# Altium footprint library PcbLib.PcbLib: 141 footprints (part 6 of 9)
Each footprint in its own frame and in the unit in brackets; x right, y up, seen from the top. Pads: shape width x height; smd on the part's side, far side on the other; paste and mask are expansions set on the pad; w line width, h text height; cw(c..) or ccw(c..) is an arc to the next point about the centre after c.
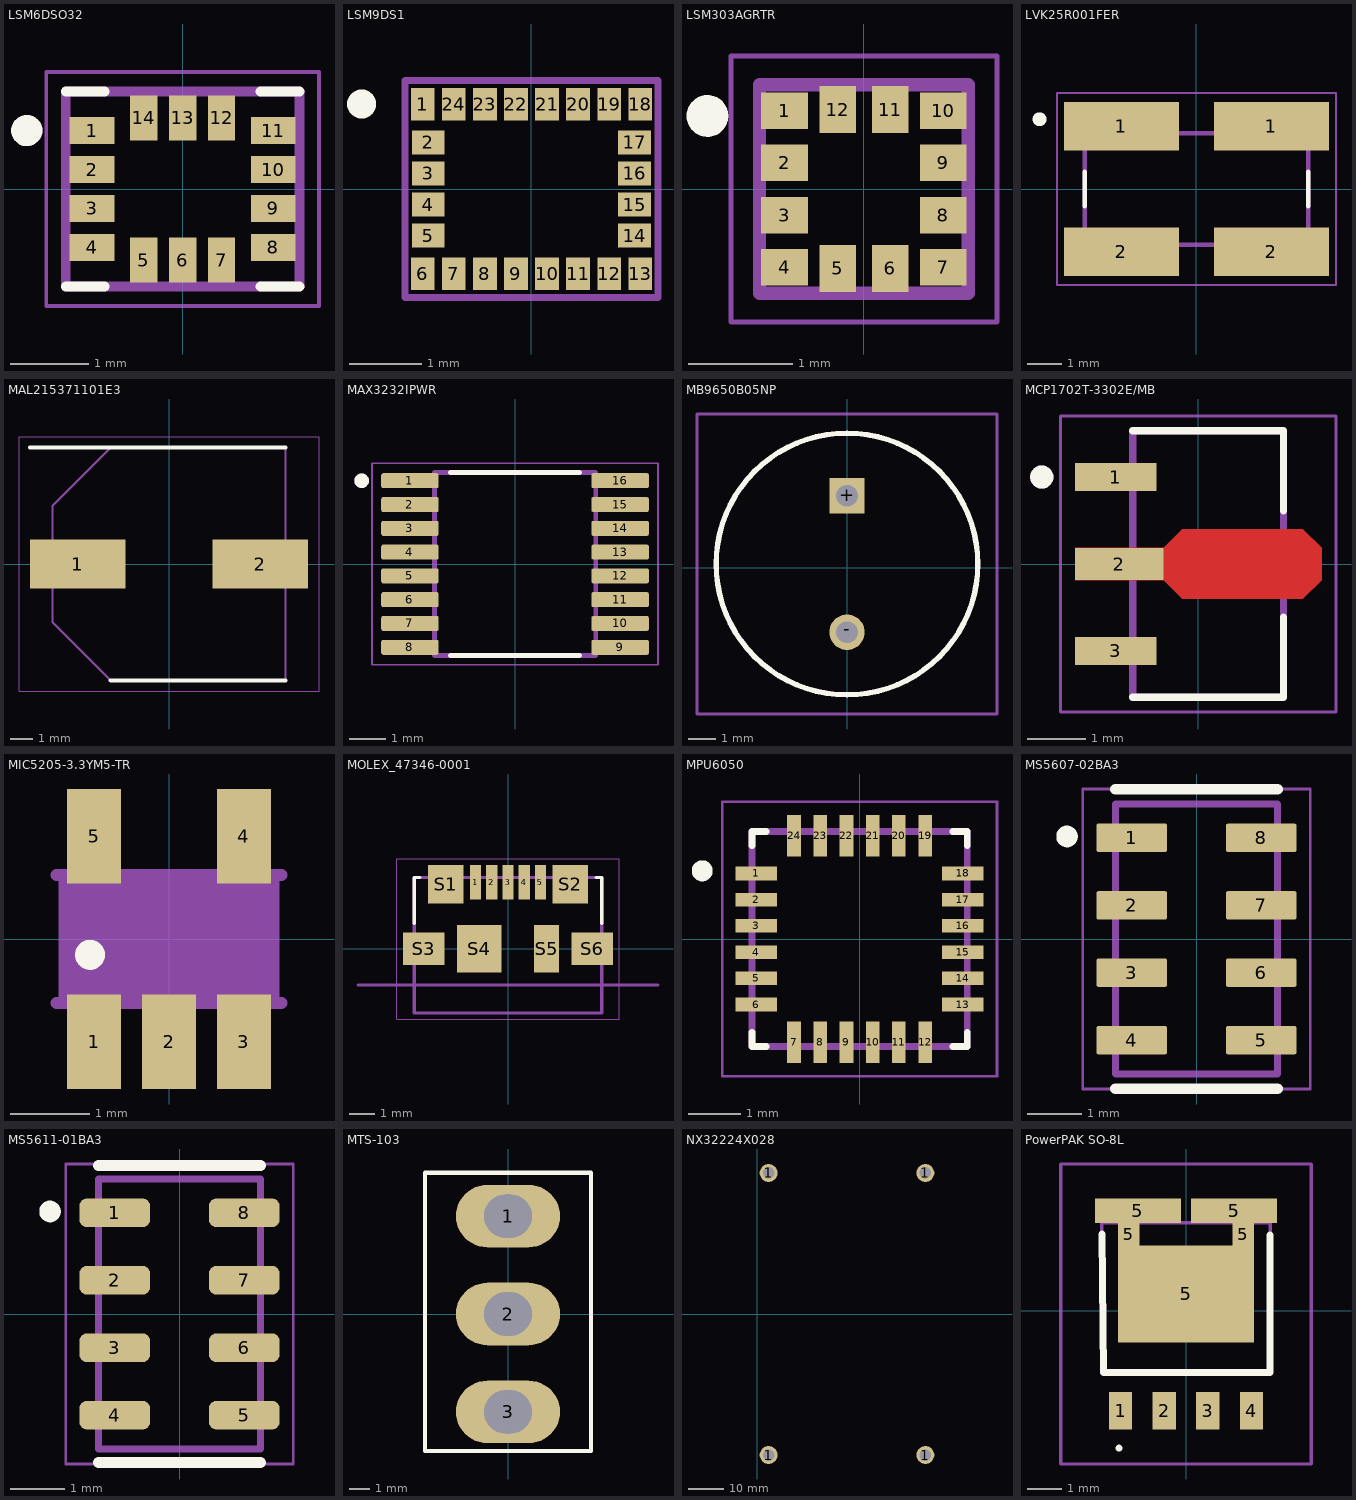
[diagram p5: the footprints below, top view; thin cyan lines are the x and y axes]

## LSM6DSO32 [mm]
pads (14):
  rect 0.575x0.35 smd mask+0.05: 1(-1.162,0.75) 2(-1.162,0.25) 3(-1.162,-0.25) 4(-1.162,-0.75) 8(1.162,-0.75) 9(1.162,-0.25) 10(1.162,0.25) 11(1.162,0.75)
  rect 0.35x0.575 smd mask+0.05: 5(-0.5,-0.913) 6(0,-0.913) 7(0.5,-0.913) 12(0.5,0.913) 13(0,0.913) 14(-0.5,0.913)
Top Overlay:
  circle w0.2: c-2,0.75 r0.1
  lines w0.127: -1.5,-1.25 -1,-1.25 ; -1.5,1.25 -1,1.25 ; 1,-1.25 1.5,-1.25 ; 1,1.25 1.5,1.25
Mechanical 13:
  circle w0.2: c-2,0.75 r0.1
  lines w0.127: -1.5,-1.25 -1.5,1.25 1.5,1.25 1.5,-1.25 -1.5,-1.25
Mechanical 15:
  lines w0.05: -1.75,-1.5 1.75,-1.5 1.75,1.5 -1.75,1.5 -1.75,-1.5
3D body "step_temp.STEP": height 0.86, standoff 0, extent -1.5,-1.25 1.5,1.25

## LSM9DS1 [mm] "IMU"
pads (24):
  rect 0.33x0.45 smd: 1(-1.505,1.175) 6(-1.505,-1.175) 7(-1.075,-1.175) 8(-0.645,-1.175) 9(-0.215,-1.175) 10(0.215,-1.175) 11(0.645,-1.175) 12(1.075,-1.175) 13(1.505,-1.175) 18(1.505,1.175) 19(1.075,1.175) 20(0.645,1.175) 21(0.215,1.175) 22(-0.215,1.175) 23(-0.645,1.175) 24(-1.075,1.175)
  rect 0.45x0.33 smd: 2(-1.425,0.645) 3(-1.425,0.215) 4(-1.425,-0.215) 5(-1.425,-0.645) 14(1.425,-0.645) 15(1.425,-0.215) 16(1.425,0.215) 17(1.425,0.645)
Top Overlay:
  lines w0.3: -2.4,1.175 ccw(c-2.35,1.175) -2.3,1.175 ; -2.4,1.175 cw(c-2.35,1.175) -2.3,1.175 ; -2.4,1.175 ccw(c-2.35,1.175) -2.3,1.175
Mechanical 15:
  lines w0.1: -1.75,-1.5 1.75,-1.5 1.75,1.5 -1.75,1.5 -1.75,-1.5
3D body "LSM9DS1.stp": height 1.13, standoff 0, extent -1.75,-1.5 1.75,1.5

## LSM303AGRTR [mm]
pads (12):
  rect 0.45x0.35 smd mask+0: 1(-0.76,0.75) 2(-0.76,0.25) 3(-0.76,-0.25) 4(-0.76,-0.75) 7(0.76,-0.75) 8(0.76,-0.25) 9(0.76,0.25) 10(0.76,0.75)
  rect 0.35x0.45 smd mask+0: 5(-0.25,-0.76) 6(0.25,-0.76) 11(0.25,0.76) 12(-0.25,0.76)
Top Overlay:
  circle w0.2: c-1.5,0.7 r0.1
Top Solder:
  region: 0.46,-1.026 0.04,-1.026 0.04,-0.5 0.46,-0.5
  region: -0.04,-1.024 -0.462,-1.024 -0.462,-0.5 -0.04,-0.5
  region: 0.46,0.501 0.04,0.501 0.04,1.02 0.46,1.02
  region: -0.04,0.502 -0.462,0.502 -0.462,1.02 -0.04,1.02
  region: 1.025,-0.966 0.508,-0.966 0.508,-0.54 1.025,-0.54
  region: 1.025,-0.461 0.506,-0.461 0.506,-0.04 1.025,-0.04
  region: 1.025,0.04 0.506,0.04 0.506,0.46 1.025,0.46
  region: 1.025,0.543 0.508,0.543 0.508,0.96 1.025,0.96
  region: -0.5,-0.963 -1.024,-0.963 -1.024,-0.54 -0.5,-0.54
  region: -0.5,-0.462 -1.024,-0.462 -1.024,-0.04 -0.5,-0.04
  region: -0.5,0.04 -1.026,0.04 -1.026,0.46 -0.5,0.46
  region: -0.5,0.542 -1.024,0.542 -1.024,0.96 -0.5,0.96
Mechanical 13:
  lines w0.127: -1,-1 -1,1 1,1 1,-1 -1,-1
Mechanical 15:
  lines w0.05: -1.275,-1.275 -1.275,1.275 1.275,1.275 1.275,-1.275 -1.275,-1.275
3D body "LSM303AGRTR.STEP": height 1, standoff 0, extent -1,-1 1,1

## LVK25R001FER [mm]
pads (4):
  rect 3.3x1.4 smd: 1(-2.15,1.8) 1(2.15,1.8) 2(-2.15,-1.8) 2(2.15,-1.8)
Top Overlay:
  circle w0.2: c-4.5,2 r0.1
  lines w0.127: -3.2,-0.5 -3.2,0.5 ; 3.2,-0.5 3.2,0.5
Mechanical 13:
  circle w0.2: c-3.25,2 r0.1
  lines w0.127: -3.2,-1.6 -3.2,1.6 3.2,1.6 3.2,-1.6 -3.2,-1.6
Mechanical 15:
  lines w0.05: -4,-2.75 -4,2.75 4,2.75 4,-2.75 -4,-2.75
3D body "wide2512.step": height 0.8, standoff 0, extent -3.151,-1.6 3.151,1.6

## MAL215371101E3 [mm]
pads (2):
  rect 4.35x2.25 smd: 1(-4.15,0) 2(4.15,0)
Top Overlay:
  lines w0.2: -6.325,5.3 5.3,5.3 ; -2.65,-5.3 5.3,-5.3
Mechanical 15:
  lines w0.1: -5.3,-2.65 -2.65,-5.3 5.3,-5.3 5.3,5.3 -2.65,5.3 -5.3,2.65 -5.3,-2.65
Mechanical 20:
  lines w0.05: -6.825,-5.8 -6.825,5.8 6.825,5.8 6.825,-5.8 -6.825,-5.8
3D body "MAL215371101E3.stp": height 10.6, standoff 0, extent -5.6,-5.3 5.6,5.3

## MAX3232IPWR [mm]
pads (16):
  rrect25% 1.57x0.41 smd: 1(-2.87,2.275) 2(-2.87,1.625) 3(-2.87,0.975) 4(-2.87,0.325) 5(-2.87,-0.325) 6(-2.87,-0.975) 7(-2.87,-1.625) 8(-2.87,-2.275) 9(2.87,-2.275) 10(2.87,-1.625) 11(2.87,-0.975) 12(2.87,-0.325) 13(2.87,0.325) 14(2.87,0.975) 15(2.87,1.625) 16(2.87,2.275)
Top Overlay:
  circle w0.2: c-4.19,2.275 r0.1
  lines w0.127: -1.765,-2.5 1.765,-2.5 ; -1.765,2.5 1.765,2.5
Mechanical 13:
  circle w0.2: c-4.19,2.275 r0.1
  lines w0.127: -2.2,-2.5 -2.2,2.5 2.2,2.5 2.2,-2.5 -2.2,-2.5
Mechanical 15:
  lines w0.05: -3.905,-2.75 -3.905,2.75 3.905,2.75 3.905,-2.75 -3.905,-2.75
3D body "step_temp.STEP": height 1.16, standoff -0.04, extent -3.2,-2.5 3.2,2.5

## MB9650B05NP [mm]
pads (2):
  rect 1.3x1.3 hole 0.8: +(0,2.64)
  round 1.3 hole 0.8: -(0,-2.36)
Top Overlay:
  lines w0.2: 0,-4.66 cw(c0,0.14) 0,4.94 cw(c0,0.14) 0,-4.66
Mechanical 13:
  lines w0.1: 0,-4.66 cw(c0,0.14) 0,4.94 cw(c0,0.14) 0,-4.66
Mechanical 15:
  lines w0.1: -5.5,-5.36 5.5,-5.36 5.5,5.64 -5.5,5.64 -5.5,-5.36
3D body "MB9650B05NP.STEP": height 5.01, standoff -5.49, extent -4.8,-4.66 4.8,4.94

## MCP1702T-3302E/MB [mm]
pads (3):
  rect 1.4x0.48 smd: 1(-1.425,1.5) 3(-1.425,-1.5)
  rect 1.525x0.56 smd mask+0: 2(-1.365,0)
Top Layer:
  region: 2.125,0.28 2.125,-0.28 1.805,-0.6 -0.28,-0.6 -0.6,-0.28 -2.125,-0.28 -2.125,0.28 -0.6,0.28 -0.28,0.6 1.805,0.6
Top Overlay:
  circle w0.2: c-2.7,1.5 r0.1
  lines w0.127: -1.13,-2.3 1.47,-2.3 1.47,-0.92 ; -1.13,2.3 1.47,2.3 1.47,0.92
Top Paste:
  region: 1.623,-0.38 -0.098,-0.38 -0.098,0.38 1.623,0.38
Top Solder:
  region: 2.225,0.28 2.225,-0.28 1.805,-0.7 -0.28,-0.7 -0.6,-0.38 -2.225,-0.38 -2.225,0.38 -0.6,0.38 -0.28,0.7 1.805,0.7
Mechanical 13:
  circle w0.2: c-2.7,1.5 r0.1
  lines w0.127: -1.13,-2.3 -1.13,2.3 1.47,2.3 1.47,-2.3 -1.13,-2.3
Mechanical 15:
  lines w0.05: -2.375,-2.55 -2.375,2.55 2.375,2.55 2.375,-2.55 -2.375,-2.55
3D body "AP2205-33YR-13.STEP": height 1.6, standoff 0, extent -2.075,-2.25 2.025,2.25

## MIC5205-3.3YM5-TR [mm]
pads (5):
  rect 0.69x1.2 smd: 1(-0.95,-1.3) 2(0,-1.3) 3(0.95,-1.3) 4(0.95,1.3) 5(-0.95,1.3)
Top Overlay:
  circle w0.2: c-1,-0.2 r0.09
Mechanical 13:
  region: -0.7,-1.5 -1.2,-1.5 -1.2,-0.85 -0.7,-0.85
  region: 0.25,-1.502 -0.25,-1.502 -0.25,-0.85 0.25,-0.85
  region: 1.2,-1.502 0.701,-1.502 0.701,-0.85 1.2,-0.85
  region: 1.2,0.851 0.701,0.851 0.701,1.5 1.2,1.5
  region: -0.7,0.85 -1.201,0.85 -1.201,1.5 -0.7,1.5
  lines w0.152: -1.422,-0.81 1.422,-0.81 ; -1.422,0.81 1.422,0.81
Mechanical 15:
  region: 1.397,-0.762 -1.397,-0.762 -1.397,0.762 1.397,0.762
3D body "MIC5205-3.3YM5-TR.stp": height 1.45, standoff 0, extent -1.45,-1.4 1.45,1.4

## MOLEX_47346-0001 [mm]
pads (11):
  rect 0.45x1.38 smd: 1(-1.3,2.66) 2(-0.65,2.66) 3(0,2.66) 4(0.65,2.66) 5(1.3,2.66)
  rect 1.425x1.55 smd: S1(-2.488,2.575) S2(2.488,2.575)
  rect 1.65x1.3 smd: S3(-3.375,0) S6(3.375,0)
  rect 1.8x1.9 smd: S4(-1.15,0)
  rect 1x1.9 smd: S5(1.55,0)
Top Overlay:
  lines w0.127: -3.75,1 -3.75,2.85 -3.52,2.85 ; 3.52,2.85 3.75,2.85 3.75,1
Mechanical 13:
  lines w0.127: -6,-1.45 6,-1.45 ; -3.75,-2.58 -3.75,2.85 3.75,2.85 3.75,-2.58 -3.75,-2.58
Mechanical 15:
  lines w0.05: -4.45,-2.83 4.45,-2.83 4.45,3.6 -4.45,3.6 -4.45,-2.83
3D body "step_temp.STEP": height 2.7, standoff -0.25, extent -4.18,-2.93 4.18,2.5

## MPU6050 [mm]
pads (24):
  rect 0.79x0.26 smd: 1(-1.97,1.25) 2(-1.97,0.75) 3(-1.97,0.25) 4(-1.97,-0.25) 5(-1.97,-0.75) 6(-1.97,-1.25) 13(1.97,-1.25) 14(1.97,-0.75) 15(1.97,-0.25) 16(1.97,0.25) 17(1.97,0.75) 18(1.97,1.25)
  rect 0.26x0.79 smd: 7(-1.25,-1.97) 8(-0.75,-1.97) 9(-0.25,-1.97) 10(0.25,-1.97) 11(0.75,-1.97) 12(1.25,-1.97) 19(1.25,1.97) 20(0.75,1.97) 21(0.25,1.97) 22(-0.25,1.97) 23(-0.75,1.97) 24(-1.25,1.97)
Top Overlay:
  circle w0.2: c-3,1.3 r0.1
  lines w0.127: -2.05,-1.778 -2.05,-2.05 -1.778,-2.05 ; -2.05,1.778 -2.05,2.05 -1.778,2.05 ; 1.778,-2.05 2.05,-2.05 2.05,-1.778 ; 1.778,2.05 2.05,2.05 2.05,1.778
Mechanical 13:
  lines w0.127: -2.05,-2.05 -2.05,2.05 2.05,2.05 2.05,-2.05 -2.05,-2.05
Mechanical 15:
  lines w0.05: -2.62,-2.62 -2.62,2.62 2.62,2.62 2.62,-2.62 -2.62,-2.62
3D body "step_temp.STEP": height 0.93, standoff -0.02, extent -2,-2 2,2

## MS5607-02BA3 [mm]
pads (8):
  rrect15% 1.31x0.53 smd: 1(-1.2,1.875)
  rrect16% 1.31x0.53 smd: 2(-1.2,0.625) 3(-1.2,-0.625) 4(-1.2,-1.875) 5(1.2,-1.875) 6(1.2,-0.625) 7(1.2,0.625) 8(1.2,1.875)
Top Overlay:
  circle w0.2: c-2.4,1.9 r0.1
  lines w0.2: -1.5,-2.775 1.5,-2.775 ; -1.5,2.775 1.5,2.775
Mechanical 13:
  circle w0.2: c-1.127,1.873 r0.1
  lines w0.127: -1.5,-2.5 -1.5,2.5 1.5,2.5 1.5,-2.5 -1.5,-2.5
Mechanical 15:
  lines w0.05: -2.11,-2.78 -2.11,2.78 2.11,2.78 2.11,-2.78 -2.11,-2.78
3D body "step_temp.STEP": height 1.1, standoff 0, extent -1.5,-2.5 1.5,2.5

## MS5611-01BA3 [mm]
pads (8):
  rrect50% 1.31x0.53 smd: 1(-1.2,1.875) 2(-1.2,0.625) 3(-1.2,-0.625) 4(-1.2,-1.875) 5(1.2,-1.875) 6(1.2,-0.625) 7(1.2,0.625) 8(1.2,1.875)
Top Overlay:
  circle w0.2: c-2.4,1.9 r0.1
  lines w0.2: -1.5,-2.75 1.5,-2.75 ; -1.5,2.75 1.5,2.75
Mechanical 13:
  lines w0.127: -1.5,-2.5 -1.5,2.5 1.5,2.5 1.5,-2.5 -1.5,-2.5
Mechanical 15:
  lines w0.05: -2.11,-2.78 2.11,-2.78 2.11,2.78 -2.11,2.78 -2.11,-2.78
3D body "step_temp.STEP": height 1.1, standoff 0, extent -1.5,-2.5 1.5,2.5

## MTS-103 [mm]
pads (3):
  oval 5.02x3.01 hole 2.1 slot 2.3 at 0 deg: 1(0,4.713) 2(0,0) 3(0,-4.713)
Top Overlay:
  lines w0.2: -4,-6.6 4,-6.6 4,6.8 -4,6.8 -4,-6.6
3D body "MTS-103.step": height 30.15, standoff -3.19, extent -6,-6.6 6,6.792

## NX32224X028 [mm]
pads (4):
  round 5 hole 3.2: 1(3.2,-39.3) 1(3.2,39.3) 1(46.9,-39.3) 1(46.9,39.3)
3D body "NX32224K028-011.STEP": height 13.46, standoff 2.21, extent 0,-42.5 50.049,42.5

## PowerPAK SO-8L [mm]
pads (9):
  rect 0.68x1.1 smd: 1(-1.905,-2.913) 2(-0.635,-2.913) 3(0.635,-2.913) 4(1.905,-2.913)
  rect 0.63x0.66 smd: 5(-1.665,2.228) 5(1.665,2.228)
  rect 2.5x0.71 smd: 5(-1.4,2.913) 5(1.4,2.913)
  rect 3.96x2.82 smd: 5(0,0.487)
Top Overlay:
  lines w0.1: -2,-4 ccw(c-1.95,-4) -1.9,-4 ccw(c-1.95,-4) -2,-4
  lines w0.2: -2.45,2.228 -2.4,-1.8 2.45,-1.8 2.45,2.2
Mechanical 15:
  lines w0.1: -2.45,-1.812 2.45,-1.812 2.45,2.558 -2.45,2.558 -2.45,-1.812
Mechanical 20:
  lines w0.1: -3.65,-4.463 3.65,-4.463 3.65,4.268 -3.65,4.268 -3.65,-4.463
3D body "POWERPAK SO-8L.stp": height 1.11, standoff -0.18, extent -2.45,-3.257 2.45,2.913